# Altium footprint library lib_ic_FOOTPRINTS.PcbLib: 98 footprints (part 5 of 7)
Each footprint in its own frame and in the unit in brackets; x right, y up, seen from the top. Pads: shape width x height; smd on the part's side, far side on the other; paste and mask are expansions set on the pad; w line width, h text height; cw(c..) or ccw(c..) is an arc to the next point about the centre after c.
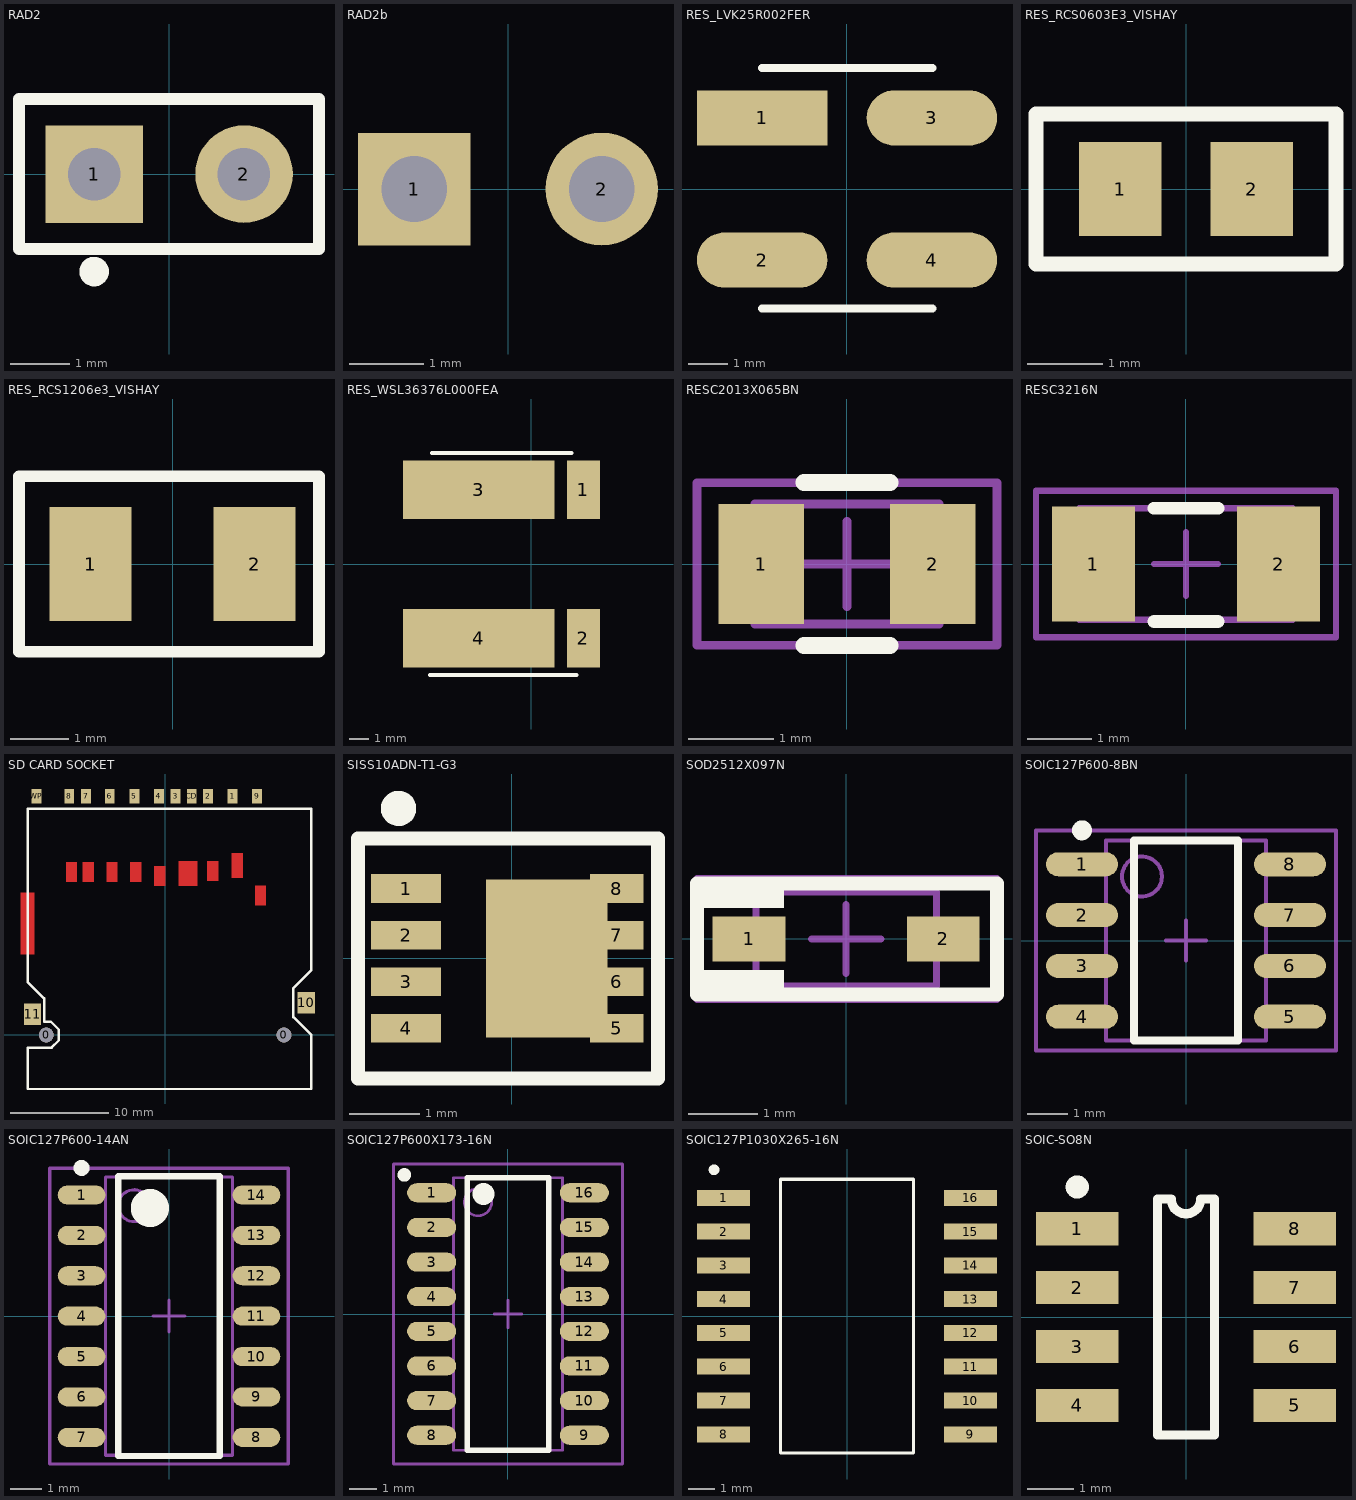
[diagram p4: the footprints below, top view; thin cyan lines are the x and y axes]

## RAD2 [mil] "Radial Cap, Thru-Hole; 2 Leads; 0.1 in Pin Spacing"
pads (2):
  rect 65x65 hole 35: 1(-50,0)
  round 65 hole 35: 2(50,0)
Top Overlay:
  circle w9.84: c-49.92,-65 r4.92
  lines w7.87: -100,-50 -100,50 100,50 100,-50 -100,-50
3D body "022284020.stp": height 330, standoff -125, extent -97.5,-51.49 102.5,46.5

## RAD2b [mil] "Radial Cap, Thru-Hole; 2 Leads; 0.1 in Pin Spacing"
pads (2):
  rect 60x60 hole 35: 1(-50,0)
  round 60 hole 35: 2(50,0)

## RES_LVK25R002FER [mm]
pads (4):
  rect 3.3x1.4 smd: 1(-2.15,1.8)
  oval 3.3x1.4 smd: 2(-2.15,-1.8) 3(2.15,1.8) 4(2.15,-1.8)
Top Overlay:
  lines w0.2: -2.15,-3.026 2.168,-3.026 ; -2.15,3.07 2.168,3.07
3D body "LVK25R002FER.stp": height 0.56, standoff 0.01, extent -3.2,-1.6 3.2,1.6

## RES_RCS0603E3_VISHAY [mm]
pads (2):
  rect 1.1x1.25 smd: 1(-0.875,0) 2(0.875,0)
Top Overlay:
  lines w0.2: -2,-1 2,-1 2,1 -2,1 -2,-1
3D body "RCS060310R0FKEA.STEP": height 0.51, standoff 0.01, extent -0.775,-0.425 0.775,0.425

## RES_RCS1206e3_VISHAY [mm]
pads (2):
  rect 1.4x1.95 smd: 1(-1.4,0) 2(1.4,0)
Top Overlay:
  lines w0.2: -2.625,-1.5 -2.625,0 -2.625,1.5 2.5,1.5 2.5,-1.5 -2.625,-1.5
3D body "RCS12062R00JNEA.STEP": height 0.66, standoff 0.01, extent -1.6,-0.8 1.6,0.8

## RES_WSL36376L000FEA [mm]
pads (4):
  rect 1.68x2.95 smd: 1(2.63,3.735) 2(2.63,-3.735)
  rect 7.62x2.95 smd: 3(-2.63,3.735) 4(-2.63,-3.735)
Top Overlay:
  lines w0.2: -5.08,-5.588 2.286,-5.588 ; -5,5.588 2.032,5.588
3D body "WSL3637 (0.002 to 0.01).STEP": height 0.65, standoff 0.01, extent -5.998,-4.572 3.4,4.572

## RESC2013X065BN [mm] "Chip Resistor, 0805, Body 2.0x1.3mm, Pads modified for 1mm spacing."
height 0.65
pads (2):
  rect 1x1.4 smd: 1(-1,0) 2(1,0)
Top Overlay:
  lines w0.2: -0.5,-0.95 0.5,-0.95 ; -0.5,0.95 0.5,0.95
Mechanical 13:
  lines w0.1: -1.075,-0.7 1.075,-0.7 1.075,0.7 -1.075,0.7 -1.075,-0.7
Mechanical 15:
  lines w0.1: -0.5,0 0.5,0 ; 0,-0.5 0,0.5 ; -1.75,-0.95 1.75,-0.95 1.75,0.95 -1.75,0.95 -1.75,-0.95
3D body "RS0805.step": height 0.45, standoff 0, extent -1,-0.625 1,0.625

## RESC3216N [mm] "Chip Resistor, Body 3.2x1.6mm, IPC Medium Density"
height 0.71
pads (2):
  rect 1.3x1.8 smd: 1(-1.45,0) 2(1.45,0)
Top Overlay:
  lines w0.2: -0.5,-0.9 0.5,-0.9 ; -0.5,0.875 0.5,0.875
Mechanical 13:
  lines w0.1: -1.675,-0.875 1.675,-0.875 1.675,0.875 -1.675,0.875 -1.675,-0.875
Mechanical 15:
  lines w0.1: -0.5,0 0.5,0 ; 0,-0.5 0,0.5 ; -2.35,-1.15 2.35,-1.15 2.35,1.15 -2.35,1.15 -2.35,-1.15
3D body "User Library-RESC3216X06N.STEP": height 0.55, standoff 0, extent -1.6,-0.8 1.6,0.8

## SD CARD SOCKET [mm]
pads (15):
  round 1.5 hole 1.5: 0(-12.1,0) 0(12.1,0)
  rect 1x1.5 smd: 1(6.875,24.3) 2(4.375,24.3) 3(1.075,24.3) 4(-0.625,24.3) 5(-3.125,24.3) 6(-5.625,24.3) 7(-8.05,24.3) 8(-9.75,24.3) 9(9.375,24.3) CD(2.725,24.3) WP(-13.1,24.3)
  rect 1.778x2.2 smd: 10(14.4,3.3) 11(-13.5,2.1)
Top Layer:
  pour cut-out: -10.075,15.6 -10.075,17.6 -8.975,17.6 -8.975,15.6
  pour cut-out: -8.375,15.6 -8.375,17.6 -7.275,17.6 -7.275,15.6
  pour cut-out: -5.95,15.6 -5.95,17.6 -4.85,17.6 -4.85,15.6
  pour cut-out: -3.525,15.6 -3.525,17.6 -2.425,17.6 -2.425,15.6
  pour cut-out: 4.3,15.7 4.3,17.7 5.4,17.7 5.4,15.7
  pour cut-out: 1.4,15.2 1.4,17.7 3.3,17.7 3.3,15.2
  pour cut-out: -1.1,15.2 -1.1,17.2 0,17.2 0,15.2
  pour cut-out: 6.8,16 6.8,18.5 7.9,18.5 7.9,16
  pour cut-out: 9.175,13.2 9.175,15.2 10.275,15.2 10.275,13.2
  pour cut-out: -14.7,8.2 -13.3,8.2 -13.3,14.5 -14.7,14.5
Top Overlay:
  lines w0.254: -14,-5.5 -14,-1.275 -11.55,-1.275 -10.825,-0.55 -10.825,0.55 -11.625,1.35 -12.325,1.35 -12.325,3.725 -14,5.4 -14,23.025 14.9,23.025 14.9,6.6 13.075,4.775 13.075,1.825 14.9,0 14.9,-5.5 -14,-5.5
3D body: height 4, standoff 0, extent -14,-5.5 14.925,23.95

## SISS10ADN-T1-G3 [mm]
pads (9):
  rect 0.99x0.405 smd: 1(-1.492,0.99) 2(-1.492,0.33) 3(-1.492,-0.33) 4(-1.492,-0.99)
  rect 0.76x0.405 smd: 5(1.493,-0.99) 6(1.493,-0.33) 7(1.493,0.33) 8(1.493,0.99)
  rect 1.725x2.235 smd: ""(0.5,-0.002)
Top Overlay:
  circle w0.25: c-1.6,2.125 r0.125
  lines w0.2: -2.175,-1.7 2.075,-1.7 2.075,1.7 -2.175,1.7 -2.175,-1.7
3D body "User Library-POWERPAK 1212-8SWLH.STEP": height 1.05, standoff 0.01, extent -1.65,-1.525 1.65,1.525

## SOD2512X097N [mm] "SOD-323, 2 Lead, Conforming to JEITA SC90 standard // Source: SOD-323 Package 2008, Fairchild"
height 0.97
pads (2):
  rect 1.05x0.65 smd: 1(-1.4,0) 2(1.4,0)
Top Overlay:
  region: -2.15,-0.8 -0.9,-0.8 -0.9,-0.45 -2.05,-0.45 -2.05,0.45 -0.9,0.45 -0.9,0.8 -2.15,0.8
  lines w0.2: -2.15,-0.8 -2.15,0.8 2.175,0.8 2.175,-0.8 -2.15,-0.8
Mechanical 13:
  lines w0.1: -1.3,-0.675 1.3,-0.675 1.3,0.675 -1.3,0.675 -1.3,-0.675
Mechanical 15:
  lines w0.1: -0.5,0 0.5,0 ; 0,-0.5 0,0.5 ; -2.15,-0.875 -2.15,0.875 2.175,0.875 2.175,-0.875 -2.15,-0.875
3D body "User Library-SOD323-1.step": height 1.1, standoff 0, extent -1.3,-0.675 1.3,0.675

## SOIC127P600-8BN [mm] "SOIC, 8-Leads, Body 4.9x3.9mm, Pitch 1.27mm, IPC Medium Density"
height 2.59
pads (8):
  oval 1.8x0.6 smd: 1(-2.6,1.905) 2(-2.6,0.635) 3(-2.6,-0.635) 4(-2.6,-1.905) 5(2.6,-1.905) 6(2.6,-0.635) 7(2.6,0.635) 8(2.6,1.905)
Top Overlay:
  circle w0.25: c-2.6,2.755 r0.125
  lines w0.2: -1.3,-2.5 1.3,-2.5 1.3,2.5 -1.3,2.5 -1.3,-2.5
Mechanical 13:
  circle w0.1: c-1.1,1.6 r0.5
  lines w0.1: -2,-2.5 2,-2.5 2,2.5 -2,2.5 -2,-2.5
Mechanical 15:
  lines w0.1: -0.5,0 0.5,0 ; 0,-0.5 0,0.5 ; -3.75,-2.75 3.75,-2.75 3.75,2.75 -3.75,2.75 -3.75,-2.75
3D body "User Library-SOIC-8-1.STEP": height 1.75, standoff 0, extent -3,-2.45 3,2.45

## SOIC127P600-14AN [mm] "SOIC, 14-Leads, Body 8.6x3.9mm, Pitch 1.27mm, IPC Medium Density"
height 1.73
pads (14):
  oval 1.5x0.6 smd: 1(-2.75,3.81) 2(-2.75,2.54) 3(-2.75,1.27) 4(-2.75,0) 5(-2.75,-1.27) 6(-2.75,-2.54) 7(-2.75,-3.81) 8(2.75,-3.81) 9(2.75,-2.54) 10(2.75,-1.27) 11(2.75,0) 12(2.75,1.27) 13(2.75,2.54) 14(2.75,3.81)
Top Overlay:
  circle w0.25: c-2.75,4.66 r0.125
  circle w0.6: c-0.6,3.4 r0.3
  lines w0.2: -1.6,-4.4 -1.6,4.4 1.6,4.4 1.6,-4.4 -1.6,-4.4
Mechanical 13:
  circle w0.1: c-1.1,3.475 r0.5
  lines w0.1: -2,-4.375 -2,4.375 2,4.375 2,-4.375 -2,-4.375
Mechanical 15:
  lines w0.1: -0.5,0 0.5,0 ; 0,-0.5 0,0.5 ; -3.75,-4.65 -3.75,4.65 3.75,4.65 3.75,-4.65 -3.75,-4.65
3D body "User Library-SOIC-14.STEP": height 1.75, standoff 0, extent -3,-4.375 3,4.375

## SOIC127P600X173-16N [mm] "SOIC, 16-Leads, Body 9.9x3.9mm, Pitch 1.27mm, IPC Low Density"
height 1.73
pads (16):
  oval 1.8x0.7 smd: 1(-2.8,4.445) 2(-2.8,3.175) 3(-2.8,1.905) 4(-2.8,0.635) 5(-2.8,-0.635) 6(-2.8,-1.905) 7(-2.8,-3.175) 8(-2.8,-4.445) 9(2.8,-4.445) 10(2.8,-3.175) 11(2.8,-1.905) 12(2.8,-0.635) 13(2.8,0.635) 14(2.8,1.905) 15(2.8,3.175) 16(2.8,4.445)
Top Overlay:
  circle w0.25: c-3.8,5.1 r0.125
  circle w0.6: c-0.9,4.4 r0.1
  lines w0.2: -1.5,-5 -1.5,5 1.5,5 1.5,-5 -1.5,-5
Mechanical 13:
  circle w0.1: c-1.1,4.1 r0.5
  lines w0.1: -2,-5 -2,5 2,5 2,-5 -2,-5
Mechanical 15:
  lines w0.1: -0.5,0 0.5,0 ; 0,-0.5 0,0.5 ; -4.2,-5.5 -4.2,5.5 4.2,5.5 4.2,-5.5 -4.2,-5.5
3D body "User Library-SOIC-16-1.STEP": height 1.4, standoff 0, extent -3,-4.95 3,4.95

## SOIC127P1030X265-16N [mm]
pads (16):
  rect 2x0.6 smd: 1(-4.64,4.445) 2(-4.64,3.175) 3(-4.64,1.905) 4(-4.64,0.635) 5(-4.64,-0.635) 6(-4.64,-1.905) 7(-4.64,-3.175) 8(-4.64,-4.445) 9(4.64,-4.445) 10(4.64,-3.175) 11(4.64,-1.905) 12(4.64,-0.635) 13(4.64,0.635) 14(4.64,1.905) 15(4.64,3.175) 16(4.64,4.445)
Top Overlay:
  circle w0.2: c-5,5.5 r0.1
  lines w0.127: -2.5,-5.15 -2.5,5.15 2.5,5.15 2.5,-5.15 -2.5,-5.15
3D body "User Library-SOIC16_Wide_JEDEC_MS-013AA.step": height 2.66, standoff 0.01, extent -5.315,-5.25 5.315,5.25

## SOIC-SO8N [mm]
pads (8):
  rect 1.78x0.72 smd: 1(-2.34,1.905) 2(-2.34,0.635) 3(-2.34,-0.635) 4(-2.34,-1.905) 5(2.34,-1.905) 6(2.34,-0.635) 7(2.34,0.635) 8(2.34,1.905)
Top Overlay:
  circle w0.25: c-2.34,2.8 r0.125
  lines w0.2: -0.615,-2.54 -0.615,2.54 -0.318,2.54 ccw(c0,2.54) 0.318,2.54 0.615,2.54 0.615,-2.54 -0.615,-2.54
3D body "IRS2008STRPBF.stp": height 1.76, standoff 0.01, extent -3,-2.45 3,2.45